# Altium footprint library 20-Switches.PcbLib: 110 footprints (part 4 of 7)
Each footprint in its own frame and in the unit in brackets; x right, y up, seen from the top. Pads: shape width x height; smd on the part's side, far side on the other; paste and mask are expansions set on the pad; w line width, h text height; cw(c..) or ccw(c..) is an arc to the next point about the centre after c.
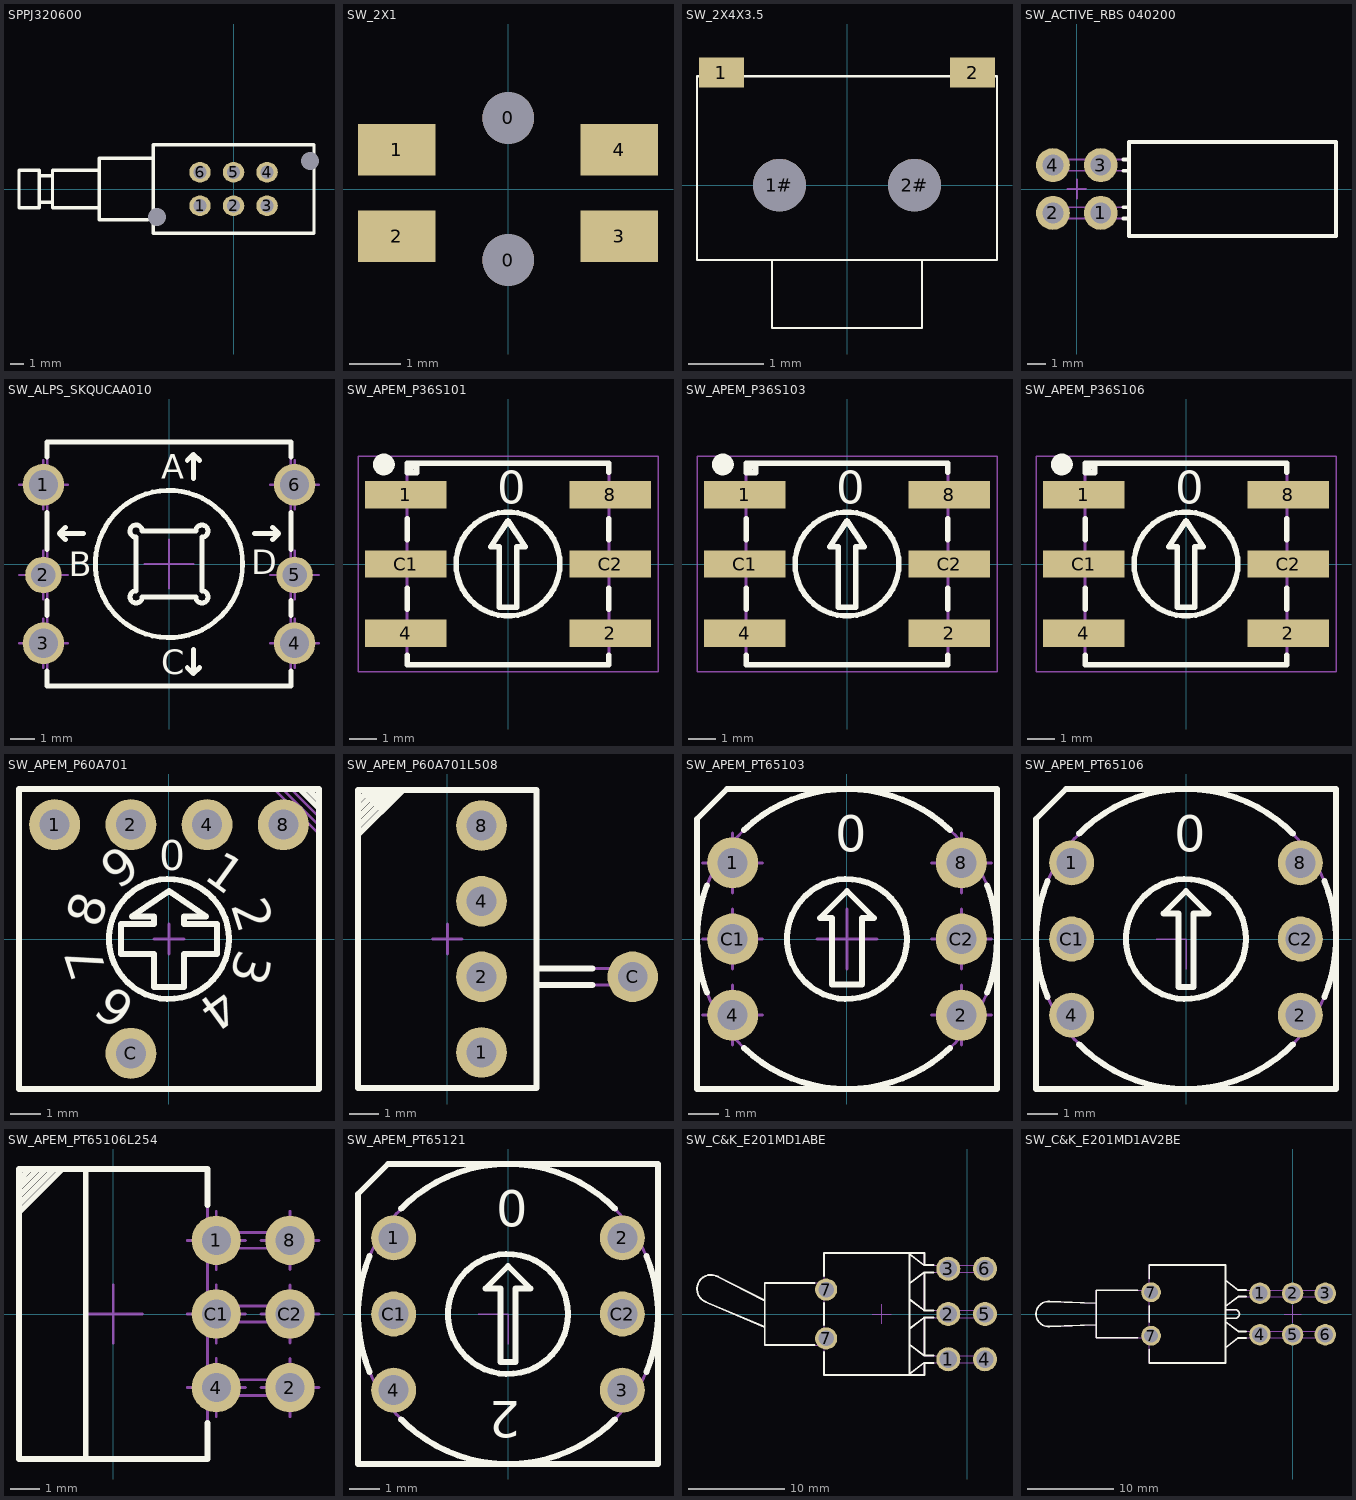
[diagram p3: the footprints below, top view; thin cyan lines are the x and y axes]

## SPPJ320600 [mm]
height 4.3
pads (8):
  oval 1.6x1.524 hole 1: 1(-2.5,-1.25) 2(0,-1.25) 3(2.5,-1.25) 4(2.5,1.25) 5(0,1.25) 6(-2.5,1.25)
  round 0 hole 1.35: #(-5.7,-2.1) #(5.7,2.1)
Top Overlay:
  lines w0.254: -14.5,1.3 -14.5,1 ; -14.5,1.4 -16,1.4 -16,-1.4 -14.5,-1.4 -14.5,-1 ; -10,-1.4 -13.5,-1.4 -13.5,-1 ; -10,1.4 -13.5,1.4 -13.5,1 ; -6.4,-2.3 -10,-2.3 -10,2.3 -6,2.3 ; -14.5,-1 -14.5,1 ; -14.5,-1 -13.5,-1 ; -14.5,1 -13.5,1 ; -13.5,-1 -13.5,1 ; -6,-3.3 -6,3.3 6,3.3 6,-3.3 -6,-3.3
3D body "sppj320600.stp": height 8.3, standoff -2.5, extent -16.5,-3.3 6,3.3

## SW_2X1 [mm]
height 4.3
pads (6):
  round 1 hole 1 mask+0.07: 0(0,-1.375) 0(0,1.375)
  rect 1.5x1 smd mask+0.07: 1(-2.159,0.762) 2(-2.159,-0.914) 3(2.15,-0.914)
  rect 1.5x1 smd mask+0.051: 4(2.15,0.762)
3D body "uk-smt4.stp": height 2.85, standoff 0, extent -2.435,-1.375 2.435,1.809

## SW_2X4X3.5 [mm]
height 4.3
pads (4):
  rect 0.6x0.4 smd: 1(-1.675,1.5)
  round 0.7 hole 0.7 mask+0.07: 1#(-0.9,0) 2#(0.9,0)
  rect 0.6x0.4 smd mask+0.07: 2(1.675,1.5)
Top Overlay:
  lines w0.03: -2,-1 2,-1 ; -2,-0.991 -2,1.45 2,1.45 2,-0.991 ; -1,-1 -1,-1.905 1,-1.905 1,-1
3D body "sw_2-4-3_5.stp": height 2, standoff 0, extent -1.725,-1.846 1.775,1.454
3D body "0_6-0_4.stp": height 0.02, standoff 0, extent -1.976,1.299 -1.376,1.699
3D body "0_6-0_4.stp": height 0.02, standoff 0, extent 1.377,1.299 1.977,1.699

## SW_ACTIVE_RBS 040200 [mm] "Body L  11mm x W 5mm x H 6mm - Rollerball Tilt Switch"
height 6
pads (4):
  round 1.8 hole 1.1: 1(1.27,-1.27) 2(-1.27,-1.27) 3(1.27,1.27) 4(-1.27,1.27)
Top Overlay:
  lines w0.2: 2.483,-1.57 2.77,-1.57 ; 2.483,-0.97 2.77,-0.97 ; 2.483,0.97 2.77,0.97 ; 2.483,1.57 2.77,1.57 ; 2.77,-2.5 13.77,-2.5 13.77,2.5 2.77,2.5 2.77,-2.5
Mechanical 8:
  lines w0.1: -1.77,-1.27 -1.27,-1.27 ; -1.77,1.27 -1.27,1.27 ; -1.27,-1.77 -1.27,-1.27 ; -1.27,-0.77 -1.27,-1.27 ; -1.27,0.77 -1.27,1.27 ; -1.27,1.77 -1.27,1.27 ; -0.77,-1.27 -1.27,-1.27 ; -0.77,1.27 -1.27,1.27 ; -0.5,0 0,0 ; 0,-0.5 0,0 ; 0,0.5 0,0 ; 0.5,0 0,0 ; 0.77,-1.27 1.27,-1.27 ; 0.77,1.27 1.27,1.27 ; 1.27,-1.77 1.27,-1.27 ; 1.27,-0.77 1.27,-1.27 ; 1.27,0.77 1.27,1.27 ; 1.27,1.77 1.27,1.27 ; 1.77,-1.27 1.27,-1.27 ; 1.77,1.27 1.27,1.27
Mechanical 14:
  lines w0.1: 2.77,-1.57 -1.57,-1.57 -1.57,-0.97 2.77,-0.97 ; 2.77,0.97 -1.57,0.97 -1.57,1.57 2.77,1.57 ; 2.77,-2.5 13.77,-2.5 13.77,2.5 2.77,2.5 2.77,-2.5
3D body "SW_ACTIVE_RBS 040200.stp": height 6, standoff -3.6, extent -1.57,-2.5 13.77,2.5

## SW_ALPS_SKQUCAA010 [mm] "Compact 10mm square TACT Switch type provides compound actions of 4-directional and center push"
height 10
pads (6):
  round 1.7 hole 1.2: 1(-5.15,3.25) 3(-5.15,-3.25) 4(5.15,-3.25) 6(5.15,3.25)
  round 1.5 hole 1: 2(-5.15,-0.45) 5(5.15,-0.45)
Top Overlay:
  circle w0.2: c0,0 r3.02
  lines w0.2: -5,-4.39 -5,-5 5,-5 5,-4.39 ; -5,-2.11 -5,-1.489 ; -5,0.589 -5,2.11 ; -5,4.39 -5,5 5,5 5,4.39 ; -4.25,1 -4.5,1.25 ; -4.25,1.5 -4.5,1.25 ; -3.5,1.25 -4.5,1.25 ; 0.75,-4.25 1,-4.5 ; 0.75,4.25 1,4.5 ; 1,-3.5 1,-4.5 ; 1,3.5 1,4.5 ; 1.25,-4.25 1,-4.5 ; 1.25,4.25 1,4.5 ; 3.5,1.25 4.5,1.25 ; 4.25,1 4.5,1.25 ; 4.25,1.5 4.5,1.25 ; 5,-2.11 5,-1.489 ; 5,0.589 5,2.11 ; -1.35,-1.1 ccw(c-1.35,-1.35) -1.1,-1.35 1.1,-1.35 ccw(c1.35,-1.35) 1.35,-1.1 1.35,1.1 ccw(c1.35,1.35) 1.1,1.35 -1.1,1.35 ccw(c-1.35,1.35) -1.35,1.1 -1.35,-1.1
  text "C" at -0.318,-4.51 h1
  text "B" at -4.118,-0.51 h1
  text "D" at 3.382,-0.41 h1
  text "A" at -0.318,3.49 h1
Mechanical 8:
  lines w0.1: -6.15,-3.25 -5.15,-3.25 ; -6.15,-0.45 -5.15,-0.45 ; -6.15,3.25 -5.15,3.25 ; -5.15,-4.25 -5.15,-3.25 ; -5.15,-2.25 -5.15,-3.25 ; -5.15,-1.45 -5.15,-0.45 ; -5.15,0.55 -5.15,-0.45 ; -5.15,2.25 -5.15,3.25 ; -5.15,4.25 -5.15,3.25 ; -4.15,-3.25 -5.15,-3.25 ; -4.15,-0.45 -5.15,-0.45 ; -4.15,3.25 -5.15,3.25 ; -1,0 0,0 ; 0,-1 0,0 ; 0,1 0,0 ; 1,0 0,0 ; 4.15,-3.25 5.15,-3.25 ; 4.15,-0.45 5.15,-0.45 ; 4.15,3.25 5.15,3.25 ; 5.15,-4.25 5.15,-3.25 ; 5.15,-2.25 5.15,-3.25 ; 5.15,-1.45 5.15,-0.45 ; 5.15,0.55 5.15,-0.45 ; 5.15,2.25 5.15,3.25 ; 5.15,4.25 5.15,3.25 ; 6.15,-3.25 5.15,-3.25 ; 6.15,-0.45 5.15,-0.45 ; 6.15,3.25 5.15,3.25
Mechanical 14:
  circle w0.1: c0,0 r3.02
  lines w0.1: -4.25,1 -4.5,1.25 ; -4.25,1.5 -4.5,1.25 ; -3.5,1.25 -4.5,1.25 ; 0.75,-4.25 1,-4.5 ; 0.75,4.25 1,4.5 ; 1,-3.5 1,-4.5 ; 1,3.5 1,4.5 ; 1.25,-4.25 1,-4.5 ; 1.25,4.25 1,4.5 ; 3.5,1.25 4.5,1.25 ; 4.25,1 4.5,1.25 ; 4.25,1.5 4.5,1.25 ; -5,-5 5,-5 5,5 -5,5 -5,-5 ; -1.35,-1.1 ccw(c-1.35,-1.35) -1.1,-1.35 1.1,-1.35 ccw(c1.35,-1.35) 1.35,-1.1 1.35,1.1 ccw(c1.35,1.35) 1.1,1.35 -1.1,1.35 ccw(c-1.35,1.35) -1.35,1.1 -1.35,-1.1
  text "C" at -0.318,-4.51 h1
  text "B" at -4.118,-0.51 h1
  text "D" at 3.382,-0.41 h1
  text "A" at -0.318,3.49 h1
3D body "SW_ALPS_SKQUCAA010.stp": height 10, standoff -3.5, extent -5.325,-5 5.325,5

## SW_APEM_P36S101 [mm] "Body 7.4x7.4mm SMT BCD Rotary Switches, APEM P36S Series"
height 3.85
pads (6):
  rect 3x1 smd: 1(-3.75,2.54) 2(3.75,-2.54) 4(-3.75,-2.54) 8(3.75,2.54) C1(-3.75,0) C2(3.75,0)
Top Overlay:
  circle w0.4: c-4.55,3.65 r0.2
  circle w0.2: c0,0 r1.905
  lines w0.2: -3.696,-3.353 -3.696,-3.696 3.696,-3.696 ; -3.696,-1.651 -3.696,-0.889 ; -3.696,0.889 -3.696,1.651 ; 3.696,-3.683 3.696,-3.353 ; 3.696,-1.651 3.696,-0.889 ; 3.696,0.889 3.696,1.651 ; 3.696,3.365 3.696,3.696 -3.696,3.696 -3.696,3.353 ; -3.696,3.353 -3.353,3.353 -3.353,3.696 -3.696,3.353 ; -0.635,0.635 0,1.587 0.635,0.635 0.317,0.635 0.318,-1.588 -0.318,-1.588 -0.317,0.635 -0.635,0.635
  text "0" at -0.4,2.2 h1.2
Mechanical 14:
  circle w0.1: c0,0 r1.905
  lines w0.1: -3.7,0 -3.7,-3.7 ; -3.7,-3.7 -3.7,3.7 3.7,3.7 3.7,-3.7 -3.7,-3.7 ; -0.635,0.635 0,1.587 0.635,0.635 0.317,0.635 0.318,-1.588 -0.318,-1.588 -0.317,0.635 -0.635,0.635
  text "0" at -0.4,2.2 h1.2
Mechanical 15:
  lines w0.05: -5.5,-3.95 5.5,-3.95 5.5,3.95 -5.5,3.95 -5.5,-3.95
3D body "SW_APEM_P36S101.stp": height 3.85, standoff 0, extent -4.78,-3.7 4.781,3.7

## SW_APEM_P36S103 [mm] "Body 7.4x7.4mm SMT Hexadecimal Rotary Switches, APEM P36S Series"
height 3.85
pads (6):
  rect 3x1 smd: 1(-3.75,2.54) 2(3.75,-2.54) 4(-3.75,-2.54) 8(3.75,2.54) C1(-3.75,0) C2(3.75,0)
Top Overlay:
  circle w0.4: c-4.55,3.65 r0.2
  circle w0.2: c0,0 r1.905
  lines w0.2: -3.696,-3.353 -3.696,-3.696 3.696,-3.696 ; -3.696,-1.651 -3.696,-0.889 ; -3.696,0.889 -3.696,1.651 ; 3.696,-3.683 3.696,-3.353 ; 3.696,-1.651 3.696,-0.889 ; 3.696,0.889 3.696,1.651 ; 3.696,3.365 3.696,3.696 -3.696,3.696 -3.696,3.353 ; -3.696,3.353 -3.353,3.353 -3.353,3.696 -3.696,3.353 ; -0.635,0.635 0,1.587 0.635,0.635 0.317,0.635 0.318,-1.588 -0.318,-1.588 -0.317,0.635 -0.635,0.635
  text "0" at -0.4,2.2 h1.2
Mechanical 14:
  circle w0.1: c0,0 r1.905
  lines w0.1: -3.7,0 -3.7,-3.7 ; -3.7,-3.7 -3.7,3.7 3.7,3.7 3.7,-3.7 -3.7,-3.7 ; -0.635,0.635 0,1.587 0.635,0.635 0.317,0.635 0.318,-1.588 -0.318,-1.588 -0.317,0.635 -0.635,0.635
  text "0" at -0.4,2.2 h1.2
Mechanical 15:
  lines w0.05: -5.5,-3.95 5.5,-3.95 5.5,3.95 -5.5,3.95 -5.5,-3.95
3D body "SW_APEM_P36S103.stp": height 3.85, standoff 0, extent -4.78,-3.7 4.781,3.7

## SW_APEM_P36S106 [mm] "Body 7.4x7.4mm SMT Hexadecimal Complement Rotary Switches, APEM P36S Series"
height 3.85
pads (6):
  rect 3x1 smd: 1(-3.75,2.54) 2(3.75,-2.54) 4(-3.75,-2.54) 8(3.75,2.54) C1(-3.75,0) C2(3.75,0)
Top Overlay:
  circle w0.2: c0,0 r1.905
  circle w0.4: c-4.55,3.65 r0.2
  lines w0.2: -3.696,-3.353 -3.696,-3.696 3.696,-3.696 ; -3.696,-1.651 -3.696,-0.889 ; -3.696,0.889 -3.696,1.651 ; 3.696,-3.683 3.696,-3.353 ; 3.696,-1.651 3.696,-0.889 ; 3.696,0.889 3.696,1.651 ; 3.696,3.365 3.696,3.696 -3.696,3.696 -3.696,3.353 ; -3.696,3.353 -3.353,3.696 -3.353,3.353 -3.696,3.353 ; -0.635,0.635 -0.317,0.635 -0.318,-1.588 0.318,-1.588 0.317,0.635 0.635,0.635 0,1.587 -0.635,0.635
  text "0" at -0.4,2.2 h1.2
Mechanical 14:
  circle w0.1: c0,0 r1.905
  lines w0.1: -3.7,0 -3.7,-3.7 ; -3.7,-3.7 3.7,-3.7 3.7,3.7 -3.7,3.7 -3.7,-3.7 ; -0.635,0.635 -0.317,0.635 -0.318,-1.588 0.318,-1.588 0.317,0.635 0.635,0.635 0,1.587 -0.635,0.635
  text "0" at -0.4,2.2 h1.2
Mechanical 15:
  lines w0.05: -5.5,-3.95 -5.5,3.95 5.5,3.95 5.5,-3.95 -5.5,-3.95
3D body "SW_APEM_P36S106.stp": height 3.85, standoff 0, extent -4.78,-3.7 4.781,3.7

## SW_APEM_P60A701 [mm] "Body 10x10mm BCD Rotary Switches With Cross shaped slot, APEM P60A Series"
height 6
pads (5):
  round 1.7 hole 1: 1(-3.81,3.81) 2(-1.27,3.81) 4(1.27,3.81) 8(3.81,3.81) C(-1.27,-3.81)
Top Overlay:
  circle w0.2: c0,0 r2
  lines w0.2: 4.349,5 5,4.349 ; 4.631,5 5,4.631 ; 4.914,5 5,4.914 ; -5,-5 5,-5 5,5 -5,5 -5,-5 ; -1.6,-0.5 -0.5,-0.5 -0.5,-1.6 0.5,-1.6 0.5,-0.5 1.6,-0.5 1.6,0.5 0.5,0.5 0.5,0.75 1.236,0.75 0,1.6 -1.236,0.75 -0.5,0.75 -0.5,0.5 -1.6,0.5 -1.6,-0.5
  text "0" at -0.32,2.3 h1
  text "9" at -1.708,1.602 h1.2
  text "8" at -2.317,0.311 h1.2
  text "7" at -2.058,-1.11 h1.2
  text "6" at -1.017,-2.104 h1.2
  text "4" at 1.74,-1.579 h1.2
  text "3" at 2.325,-0.288 h1.2
  text "2" at 2.051,1.13 h1.2
  text "1" at 1.109,2.037 h1.2
Mechanical 8:
  lines w0.1: -4.31,3.81 -3.81,3.81 ; -3.81,3.31 -3.81,3.81 ; -3.81,4.31 -3.81,3.81 ; -3.31,3.81 -3.81,3.81 ; -1.77,-3.81 -1.27,-3.81 ; -1.77,3.81 -1.27,3.81 ; -1.27,-4.31 -1.27,-3.81 ; -1.27,-3.31 -1.27,-3.81 ; -1.27,3.31 -1.27,3.81 ; -1.27,4.31 -1.27,3.81 ; -0.77,-3.81 -1.27,-3.81 ; -0.77,3.81 -1.27,3.81 ; -0.5,0 0,0 ; 0,-0.5 0,0 ; 0,0.5 0,0 ; 0.5,0 0,0 ; 0.77,3.81 1.27,3.81 ; 1.27,3.31 1.27,3.81 ; 1.27,4.31 1.27,3.81 ; 1.77,3.81 1.27,3.81 ; 3.31,3.81 3.81,3.81 ; 3.81,3.31 3.81,3.81 ; 3.81,4.31 3.81,3.81 ; 4.31,3.81 3.81,3.81
Mechanical 14:
  circle w0.1: c0,0 r2
  lines w0.1: 3.5,5 5,3.5 ; 3.783,5 5,3.783 ; 4.066,5 5,4.066 ; 4.349,5 5,4.349 ; 4.631,5 5,4.631 ; 4.914,5 5,4.914 ; -5,-5 5,-5 5,5 -5,5 -5,-5 ; -1.6,-0.5 -0.5,-0.5 -0.5,-1.6 0.5,-1.6 0.5,-0.5 1.6,-0.5 1.6,0.5 0.5,0.5 0.5,0.75 1.236,0.75 0,1.6 -1.236,0.75 -0.5,0.75 -0.5,0.5 -1.6,0.5 -1.6,-0.5
  text "0" at -0.4,2.3 h1.2
  text "9" at -1.708,1.602 h1.2
  text "8" at -2.317,0.311 h1.2
  text "7" at -2.058,-1.11 h1.2
  text "6" at -1.017,-2.104 h1.2
  text "5" at 0.445,-2.3 h1.2
  text "4" at 1.74,-1.579 h1.2
  text "3" at 2.325,-0.288 h1.2
  text "2" at 2.051,1.13 h1.2
  text "1" at 1.109,2.037 h1.2
3D body "SW_APEM_P60A701.stp": height 6, standoff -3.5, extent -5,-5 5,5

## SW_APEM_P60A701L508 [mm] "Body 10x10mm Right Angled BCD Rotary Switches With Cross shaped slot, APEM P60A Series"
height 10
pads (5):
  round 1.7 hole 1: 1(1.15,-3.81) 2(1.15,-1.27) 4(1.15,1.27) 8(1.15,3.81) C(6.23,-1.27)
Top Overlay:
  lines w0.2: -3,3.5 -1.5,5 ; -3,3.783 -1.783,5 ; -3,4.066 -2.066,5 ; -3,4.349 -2.349,5 ; -3,4.631 -2.631,5 ; -3,4.914 -2.914,5 ; 3,-1.545 4.875,-1.545 ; 3,-0.995 4.875,-0.995 ; -3,-5 -3,5 3,5 3,-5 -3,-5
Mechanical 8:
  lines w0.1: -0.5,0 0,0 ; 0,-0.5 0,0 ; 0,0.5 0,0 ; 0.5,0 0,0 ; 0.65,-3.81 1.15,-3.81 ; 0.65,-1.27 1.15,-1.27 ; 0.65,1.27 1.15,1.27 ; 0.65,3.81 1.15,3.81 ; 1.15,-4.31 1.15,-3.81 ; 1.15,-3.31 1.15,-3.81 ; 1.15,-1.77 1.15,-1.27 ; 1.15,-0.77 1.15,-1.27 ; 1.15,0.77 1.15,1.27 ; 1.15,1.77 1.15,1.27 ; 1.15,3.31 1.15,3.81 ; 1.15,4.31 1.15,3.81 ; 1.65,-3.81 1.15,-3.81 ; 1.65,-1.27 1.15,-1.27 ; 1.65,1.27 1.15,1.27 ; 1.65,3.81 1.15,3.81 ; 5.73,-1.27 6.23,-1.27 ; 6.23,-1.77 6.23,-1.27 ; 6.23,-0.77 6.23,-1.27 ; 6.73,-1.27 6.23,-1.27
Mechanical 14:
  lines w0.1: -3,3.5 -1.5,5 ; -3,3.783 -1.783,5 ; -3,4.066 -2.066,5 ; -3,4.349 -2.349,5 ; -3,4.631 -2.631,5 ; -3,4.914 -2.914,5 ; 3,-1.545 6.38,-1.545 6.38,-0.995 3,-0.995 ; -3,-5 -3,5 3,5 3,-5 -3,-5
3D body "SW_APEM_P60A701L508.stp": height 10, standoff -3.5, extent -3,-5 6.38,5

## SW_APEM_PT65103 [mm] "Body 10x10mm, Straight Rotary Hexadecimal Code Switch Whith Screwdriver Actuator, APEM PT65 (CR65) Series"
height 6.5
pads (6):
  round 1.7 hole 1: 1(-3.81,2.54) 2(3.81,-2.54) 4(-3.81,-2.54) 8(3.81,2.54) C1(-3.81,0) C2(3.81,0)
Top Overlay:
  circle w0.2: c0,0 r2
  lines w0.2: -4.673,-1.779 cw(c0,0) -4.673,1.779 ; -3.44,-3.629 ccw(c0,0) 3.44,-3.629 ; -3.44,3.629 cw(c0,0) 3.44,3.629 ; 4.673,-1.779 ccw(c0,0) 4.673,1.779 ; -5,-5 -5,4 -4,5 5,5 5,-5 -5,-5 ; -0.9,0.7 0,1.6 0.9,0.7 0.5,0.7 0.5,-1.52 -0.5,-1.52 -0.5,0.7 -0.9,0.7
  text "0" at -0.4,2.9 h1.2
Mechanical 8:
  lines w0.1: -4.81,-2.54 -3.81,-2.54 ; -4.81,0 -3.81,0 ; -4.81,2.54 -3.81,2.54 ; -3.81,-3.54 -3.81,-2.54 ; -3.81,-1.54 -3.81,-2.54 ; -3.81,-1 -3.81,0 ; -3.81,1 -3.81,0 ; -3.81,1.54 -3.81,2.54 ; -3.81,3.54 -3.81,2.54 ; -2.81,-2.54 -3.81,-2.54 ; -2.81,0 -3.81,0 ; -2.81,2.54 -3.81,2.54 ; -1,0 0,0 ; 0,-1 0,0 ; 0,1 0,0 ; 1,0 0,0 ; 2.81,-2.54 3.81,-2.54 ; 2.81,0 3.81,0 ; 2.81,2.54 3.81,2.54 ; 3.81,-3.54 3.81,-2.54 ; 3.81,-1.54 3.81,-2.54 ; 3.81,-1 3.81,0 ; 3.81,1 3.81,0 ; 3.81,1.54 3.81,2.54 ; 3.81,3.54 3.81,2.54 ; 4.81,-2.54 3.81,-2.54 ; 4.81,0 3.81,0 ; 4.81,2.54 3.81,2.54
Mechanical 14:
  circle w0.1: c0,0 r5
  circle w0.1: c0,0 r2
  lines w0.1: -5,-5 5,-5 5,5 -4,5 -5,4 -5,-5 ; -0.9,0.7 -0.5,0.7 -0.5,-1.52 0.5,-1.52 0.5,0.7 0.9,0.7 0,1.6 -0.9,0.7
  text "1" at 0.978,2.734 h1.2
  text "7" at 1.479,-2.526 h1.2
  text "8" at 0.4,-2.9 h1.2
  text "9" at -0.767,-2.821 h1.2
  text "F" at -1.453,2.537 h1.2
  text "E" at -2.313,1.788 h1.2
  text "D" at -2.832,0.74 h1.2
  text "C" at -2.9,-0.429 h1.2
  text "B" at -2.526,-1.479 h1.2
  text "A" at -1.727,-2.374 h1.2
  text "6" at 2.313,-1.788 h1.2
  text "5" at 2.832,-0.74 h1.2
  text "4" at 2.9,0.429 h1.2
  text "3" at 2.526,1.479 h1.2
  text "2" at 1.768,2.333 h1.2
  text "0" at -0.4,2.9 h1.2
3D body "SW_APEM_PT65103.stp": height 6.5, standoff -3.6, extent -5,-5 5,5

## SW_APEM_PT65106 [mm] "Body 10x10mm, Straight Rotary Hexadecimal Code Switch Whith Screwdriver Actuator, APEM PT65 (CR65) Series"
height 6.5
pads (6):
  round 1.5 hole 1: 1(-3.81,2.54) 2(3.81,-2.54) 4(-3.81,-2.54) 8(3.81,2.54) C1(-3.81,0) C2(3.81,0)
Top Overlay:
  circle w0.2: c0,0 r2
  lines w0.2: -4.609,-1.939 cw(c0,0) -4.609,1.939 ; -3.562,-3.509 ccw(c0,0) 3.562,-3.509 ; -3.562,3.509 cw(c0,0) 3.562,3.509 ; 4.609,-1.939 ccw(c0,0) 4.609,1.939 ; -5,-5 -5,4 -4,5 5,5 5,-5 -5,-5 ; -0.75,0.85 -0.25,0.85 -0.25,-1.6 0.25,-1.6 0.25,0.85 0.75,0.85 0,1.6 -0.75,0.85
  text "0" at -0.4,2.9 h1.2
Mechanical 8:
  lines w0.05: -1,0 0,0 0,-1
  text "1" at 0.978,2.734 h1.2
  text "7" at 1.479,-2.526 h1.2
  text "8" at 0.4,-2.9 h1.2
  text "9" at -0.767,-2.821 h1.2
  text "F" at -1.453,2.537 h1.2
  text "E" at -2.313,1.788 h1.2
  text "D" at -2.832,0.74 h1.2
  text "C" at -2.9,-0.429 h1.2
  text "B" at -2.526,-1.479 h1.2
  text "A" at -1.727,-2.374 h1.2
  text "6" at 2.313,-1.788 h1.2
  text "5" at 2.832,-0.74 h1.2
  text "4" at 2.9,0.429 h1.2
  text "3" at 2.526,1.479 h1.2
  text "2" at 1.768,2.333 h1.2
Mechanical 14:
  circle w0.1: c0,0 r5
  circle w0.1: c0,0 r2
  lines w0.1: -5,-5 -5,4 -4,5 5,5 5,-5 -5,-5 ; -0.75,0.85 -0.25,0.85 -0.25,-1.6 0.25,-1.6 0.25,0.85 0.75,0.85 0,1.6 -0.75,0.85
  text "0" at -0.4,2.9 h1.2
3D body "SW_APEM_PT65106.stp": height 6.5, standoff -3.6, extent -5,-5 5,5

## SW_APEM_PT65106L254 [mm] "Body 10x10mm, Right Angled Rotary Hexadecimal Code Switch Whith Screwdriver Actuator, APEM PT65 (CR65) Series"
height 10
pads (6):
  round 1.7 hole 1: 1(3.55,2.54) 2(6.09,-2.54) 4(3.55,-2.54) 8(6.09,2.54) C1(3.55,0) C2(6.09,0)
Top Overlay:
  lines w0.2: -3.25,3.5 -1.75,5 ; -3.25,3.783 -2.033,5 ; -3.25,4.066 -2.316,5 ; -3.25,4.349 -2.598,5 ; -3.25,4.631 -2.881,5 ; -3.25,4.914 -3.164,5 ; -0.95,-5 -0.95,5 ; 3.25,-3.753 3.25,-5 -3.25,-5 -3.25,5 3.25,5 3.25,3.753
Mechanical 8:
  lines w0.1: -1,0 0,0 ; 0,-1 0,0 ; 0,1 0,0 ; 1,0 0,0 ; 2.55,-2.54 3.55,-2.54 ; 2.55,0 3.55,0 ; 2.55,2.54 3.55,2.54 ; 3.55,-3.54 3.55,-2.54 ; 3.55,-1.54 3.55,-2.54 ; 3.55,-1 3.55,0 ; 3.55,1 3.55,0 ; 3.55,1.54 3.55,2.54 ; 3.55,3.54 3.55,2.54 ; 4.55,-2.54 3.55,-2.54 ; 4.55,0 3.55,0 ; 4.55,2.54 3.55,2.54 ; 5.09,-2.54 6.09,-2.54 ; 5.09,0 6.09,0 ; 5.09,2.54 6.09,2.54 ; 6.09,-3.54 6.09,-2.54 ; 6.09,-1.54 6.09,-2.54 ; 6.09,-1 6.09,0 ; 6.09,1 6.09,0 ; 6.09,1.54 6.09,2.54 ; 6.09,3.54 6.09,2.54 ; 7.09,-2.54 6.09,-2.54 ; 7.09,0 6.09,0 ; 7.09,2.54 6.09,2.54
Mechanical 14:
  lines w0.1: -3.25,3.5 -1.75,5 ; -3.25,3.783 -2.033,5 ; -3.25,4.066 -2.316,5 ; -3.25,4.349 -2.598,5 ; -3.25,4.631 -2.881,5 ; -3.25,4.914 -3.164,5 ; -0.95,-5 -0.95,5 ; 3.25,-2.815 6.225,-2.815 6.225,-2.265 3.25,-2.265 ; 3.25,-0.275 6.225,-0.275 6.225,0.275 3.25,0.275 ; 3.25,2.265 6.225,2.265 6.225,2.815 3.25,2.815 ; -3.25,-5 3.25,-5 3.25,5 -3.25,5 -3.25,-5
3D body "SW_APEM_PT65106L254.stp": height 10, standoff -3.6, extent -3.25,-5 6.225,5

## SW_APEM_PT65121 [mm] "Body 10x10mm, Decimal Code 4 Positions Straight Rotary Switch Whith Arrow Shaped Slot Actuator, APEM PT65 (CR65) Series"
height 6.5
pads (6):
  round 1.5 hole 1: 1(-3.81,2.54) 2(3.81,2.54) 3(3.81,-2.54) 4(-3.81,-2.54) C1(-3.81,0) C2(3.81,0)
Top Overlay:
  circle w0.2: c0,0 r2
  lines w0.2: -4.609,-1.939 cw(c0,0) -4.609,1.939 ; -3.562,-3.509 ccw(c0,0) 3.562,-3.509 ; -3.562,3.509 cw(c0,0) 3.562,3.509 ; 4.609,-1.939 ccw(c0,0) 4.609,1.939 ; -5,-5 5,-5 5,5 -4,5 -5,4 -5,-5 ; -0.75,0.85 0,1.6 0.75,0.85 0.25,0.85 0.25,-1.6 -0.25,-1.6 -0.25,0.85 -0.75,0.85
  text "2" at 0.4,-2.9 h1.2
  text "0" at -0.4,2.9 h1.2
Mechanical 8:
  lines w0.05: -1,0 0,0 0,-1
  text "1" at 2.9,0.429 h1.2
  text "3" at -2.9,-0.429 h1.2
  text "2" at 0.4,-2.9 h1.2
Mechanical 14:
  circle w0.1: c0,0 r2
  circle w0.1: c0,0 r5
  lines w0.1: -5,-5 5,-5 5,5 -4,5 -5,4 -5,-5 ; -0.75,0.85 0,1.6 0.75,0.85 0.25,0.85 0.25,-1.6 -0.25,-1.6 -0.25,0.85 -0.75,0.85
  text "0" at -0.4,2.9 h1.2
3D body "SW_APEM_PT65121.stp": height 6.5, standoff -3.6, extent -5,-5 5,5

## SW_C&K_E201MD1ABE [mm] "DPDT Toggle Switch - Right Angled PCB Mounting, .300\" High Actuator, Unthreaded Bushing, C&K E Series"
height 11.43
pads (8):
  round 2.5 hole 1.8: 1(-1.982,-4.7) 2(-1.982,0) 3(-1.982,4.7) 4(1.828,-4.7) 5(1.828,0) 6(1.828,4.7)
  round 2.3 hole 1.6: 7(-14.682,-2.54) 7(-14.682,2.54)
Top Overlay:
  lines w0.2: -27.257,1.28 -21.057,-1.358 ; -27.166,1.241 cw(c-26.64,2.603) -25.934,3.881 ; -26.023,3.927 -21.057,1.402 ; -15.895,-3.24 -21.057,-3.24 -21.057,3.24 -15.895,3.24 ; -14.887,-3.925 -14.887,-6.35 -4.477,-6.35 -4.477,-5.08 ; -14.887,-1.155 -14.887,1.155 ; -14.887,3.925 -14.887,6.35 -4.477,6.35 -4.477,5.08 ; -5.997,-6.35 -5.997,6.35 ; -5.997,-6.2 -4.504,-5.08 -3.536,-5.08 ; -5.997,-3.2 -4.504,-4.32 -3.536,-4.32 ; -5.997,-1.5 -4.504,-0.38 -3.536,-0.38 ; -5.997,1.5 -4.504,0.38 -3.536,0.38 ; -5.997,3.2 -4.504,4.32 -3.536,4.32 ; -5.997,6.2 -4.504,5.08 -3.536,5.08 ; -4.477,-4.32 -4.477,-0.38 ; -4.477,0.38 -4.477,4.32
Mechanical 8:
  lines w0.1: -15.682,-2.54 -14.682,-2.54 ; -15.682,2.54 -14.682,2.54 ; -14.682,-3.54 -14.682,-2.54 ; -14.682,-1.54 -14.682,-2.54 ; -14.682,1.54 -14.682,2.54 ; -14.682,3.54 -14.682,2.54 ; -13.682,-2.54 -14.682,-2.54 ; -13.682,2.54 -14.682,2.54 ; -9.89,0 -8.89,0 ; -8.89,-1 -8.89,0 ; -8.89,1 -8.89,0 ; -7.89,0 -8.89,0 ; -2.982,-4.7 -1.982,-4.7 ; -2.982,0 -1.982,0 ; -2.982,4.7 -1.982,4.7 ; -1.982,-5.7 -1.982,-4.7 ; -1.982,-3.7 -1.982,-4.7 ; -1.982,-1 -1.982,0 ; -1.982,1 -1.982,0 ; -1.982,3.7 -1.982,4.7 ; -1.982,5.7 -1.982,4.7 ; -0.982,-4.7 -1.982,-4.7 ; -0.982,0 -1.982,0 ; -0.982,4.7 -1.982,4.7 ; 0.828,-4.7 1.828,-4.7 ; 0.828,0 1.828,0 ; 0.828,4.7 1.828,4.7 ; 1.828,-5.7 1.828,-4.7 ; 1.828,-3.7 1.828,-4.7 ; 1.828,-1 1.828,0 ; 1.828,1 1.828,0 ; 1.828,3.7 1.828,4.7 ; 1.828,5.7 1.828,4.7 ; 2.828,-4.7 1.828,-4.7 ; 2.828,0 1.828,0 ; 2.828,4.7 1.828,4.7
Mechanical 14:
  lines w0.1: -27.257,1.28 -21.057,-1.358 ; -27.166,1.241 cw(c-26.64,2.603) -25.934,3.881 ; -26.023,3.927 -21.057,1.402 ; -14.887,-3.24 -21.057,-3.24 -21.057,3.24 -14.887,3.24 ; -5.997,-6.35 -5.997,6.35 ; -5.997,-6.2 -4.504,-5.08 2.463,-5.08 2.463,-4.32 -4.504,-4.32 -5.997,-3.2 ; -5.997,-1.5 -4.504,-0.38 2.463,-0.38 2.463,0.38 -4.504,0.38 -5.997,1.5 ; -5.997,3.2 -4.504,4.32 2.463,4.32 2.463,5.08 -4.504,5.08 -5.997,6.2 ; -4.477,-5.08 -4.477,-6.35 -14.887,-6.35 -14.887,6.35 -4.477,6.35 -4.477,5.08 ; -4.477,-4.32 -4.477,-0.38 ; -4.477,0.38 -4.477,4.32
3D body "SW_C&K_E201MD1ABE.stp": height 11.43, standoff -2.88, extent -28.026,-6.35 2.532,6.35

## SW_C&K_E201MD1AV2BE [mm] "DPDT Toggle Switch - Vertical Right Angled PCB Mounting, .300\" High Actuator, Unthreaded Bushing, C&K E Series"
height 12.7
pads (8):
  round 2.5 hole 1.8: 1(-3.81,2.415) 2(0,2.415) 3(3.81,2.415) 4(-3.81,-2.415) 5(0,-2.415) 6(3.81,-2.415)
  round 2.3 hole 1.6: 7(-16.51,-2.54) 7(-16.51,2.54)
Top Overlay:
  lines w0.2: -28.468,-1.46 -22.885,-1.25 ; -28.468,1.46 -22.885,1.25 ; -28.358,-1.456 cw(c-28.468,0) -28.358,1.456 ; -18.092,-2.78 -22.885,-2.78 ; -18.092,2.78 -22.885,2.78 ; -16.715,-4.127 -16.715,-5.715 -7.825,-5.715 -7.825,5.715 -16.715,5.715 -16.715,4.127 ; -16.715,-0.953 -16.715,0.953 ; -7.825,-3.915 -6.332,-2.795 -5.416,-2.795 ; -7.825,-0.915 -6.332,-2.035 -5.416,-2.035 ; -7.825,-0.51 -6.715,-0.51 ccw(c-6.715,0) -6.715,0.51 -7.825,0.51 ; -7.825,0.915 -6.332,2.035 -5.416,2.035 ; -7.825,3.915 -6.332,2.795 -5.416,2.795 ; -22.885,-2.78 -22.885,2.78 ; -22.885,-2.78 -22.885,2.78
Mechanical 8:
  lines w0.1: -17.51,-2.54 -16.51,-2.54 ; -17.51,2.54 -16.51,2.54 ; -16.51,-3.54 -16.51,-2.54 ; -16.51,-1.54 -16.51,-2.54 ; -16.51,1.54 -16.51,2.54 ; -16.51,3.54 -16.51,2.54 ; -15.51,-2.54 -16.51,-2.54 ; -15.51,2.54 -16.51,2.54 ; -4.81,-2.415 -3.81,-2.415 ; -4.81,2.415 -3.81,2.415 ; -3.81,-3.415 -3.81,-2.415 ; -3.81,-1.415 -3.81,-2.415 ; -3.81,1.415 -3.81,2.415 ; -3.81,3.415 -3.81,2.415 ; -2.81,-2.415 -3.81,-2.415 ; -2.81,2.415 -3.81,2.415 ; -1,-2.415 0,-2.415 ; -1,0 0,0 ; -1,2.415 0,2.415 ; 0,-3.415 0,-2.415 ; 0,-1.415 0,-2.415 ; 0,-1 0,0 ; 0,1 0,0 ; 0,1.415 0,2.415 ; 0,3.415 0,2.415 ; 1,-2.415 0,-2.415 ; 1,0 0,0 ; 1,2.415 0,2.415 ; 2.81,-2.415 3.81,-2.415 ; 2.81,2.415 3.81,2.415 ; 3.81,-3.415 3.81,-2.415 ; 3.81,-1.415 3.81,-2.415 ; 3.81,1.415 3.81,2.415 ; 3.81,3.415 3.81,2.415 ; 4.81,-2.415 3.81,-2.415 ; 4.81,2.415 3.81,2.415
Mechanical 14:
  lines w0.1: -28.468,-1.46 -22.885,-1.25 ; -28.468,1.46 -22.885,1.25 ; -28.358,-1.456 cw(c-28.468,0) -28.358,1.456 ; -16.715,-2.78 -22.885,-2.78 ; -16.715,2.78 -22.885,2.78 ; -7.825,-3.915 -6.332,-2.795 4.445,-2.795 4.445,-2.035 -6.332,-2.035 -7.825,-0.915 ; -7.825,-0.51 -6.715,-0.51 ccw(c-6.715,0) -6.715,0.51 -7.825,0.51 ; -7.825,0.915 -6.332,2.035 4.445,2.035 4.445,2.795 -6.332,2.795 -7.825,3.915 ; -22.885,-2.78 -22.885,2.78 ; -22.885,-2.78 -22.885,2.78 ; -16.715,-5.715 -7.825,-5.715 -7.825,5.715 -16.715,5.715 -16.715,-5.715
3D body "SW_C&K_E201MD1AV2BE.stp": height 12.7, standoff -3.18, extent -29.915,-5.715 4.445,5.715